# Altium footprint library PCB_GENERAL.PcbLib: 226 footprints (part 10 of 15)
Each footprint in its own frame and in the unit in brackets; x right, y up, seen from the top. Pads: shape width x height; smd on the part's side, far side on the other; paste and mask are expansions set on the pad; w line width, h text height; cw(c..) or ccw(c..) is an arc to the next point about the centre after c.
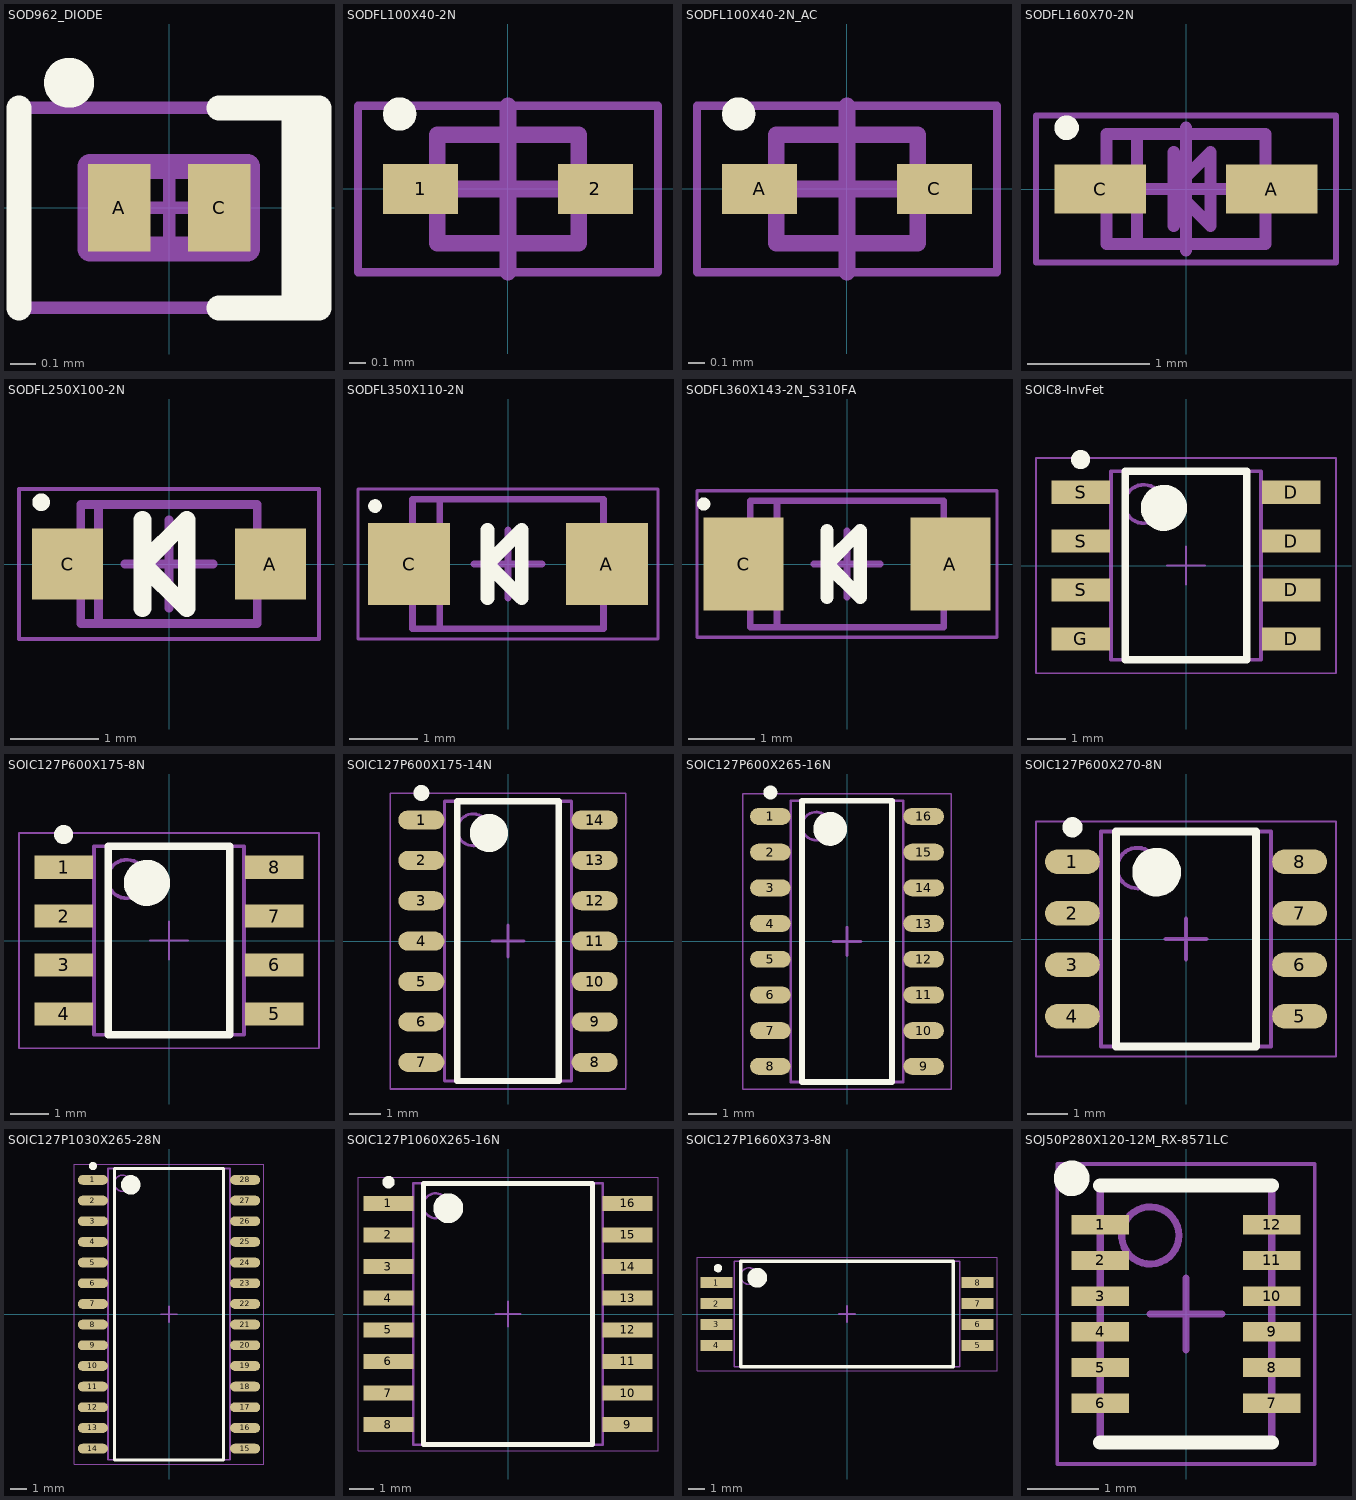
[diagram p9: the footprints below, top view; thin cyan lines are the x and y axes]

## SOD962_DIODE [mm] "DFN, 2-Leads, Body 0,30x0,60mm, Pitch 0,40mm, IPC Medium Density"
height 0.32
pads (2):
  rect 0.25x0.35 smd: A(-0.2,0) C(0.2,0)
Top Overlay:
  circle w0.1: c-0.4,0.5 r0.05
  lines w0.1: -0.6,-0.4 -0.6,0.4 ; 0.2,-0.4 0.6,-0.4 0.6,0.4 ; 0.2,0.4 0.6,0.4 ; 0.5,-0.4 0.5,0.4 0.6,0.4
Mechanical 13:
  lines w0.1: -0.1,-0.165 -0.065,-0.165 ; 0.175,-0.15 0.175,0.15 ; -0.315,-0.165 0.315,-0.165 0.315,0.165 -0.315,0.165 -0.315,-0.165
Mechanical 15:
  lines w0.05: -0.175,0 0.175,0 ; 0,-0.175 0,0.175 ; -0.6,-0.4 0.6,-0.4 0.6,0.4 -0.6,0.4 -0.6,-0.4
3D body: height 0.32, standoff 0, extent -0.315,-0.165 0.315,0.165

## SODFL100X40-2N [mm] "SODFL, 2-Leads, Body 0,60x1,00mm, IPC Medium Density"
height 0.4
pads (2):
  rect 0.45x0.3 smd: 1(-0.525,0) 2(0.525,0)
Top Overlay:
  circle w0.1: c-0.65,0.45 r0.05
Mechanical 11:
  text ".Designator" at -1.4,0.7 h1
Mechanical 13:
  lines w0.1: -0.425,-0.325 -0.425,0.325 0.425,0.325 0.425,-0.325 -0.425,-0.325
Mechanical 15:
  lines w0.05: -0.9,-0.5 -0.9,0.5 0.9,0.5 0.9,-0.5 -0.9,-0.5
  lines w0.1: -0.5,0 0.5,0 ; 0,-0.5 0,0.5
3D body: height 0.4, standoff 0, extent -0.425,-0.325 0.425,0.325

## SODFL100X40-2N_AC [mm] "SODFL, 2-Leads, Body 0,60x1,00mm, IPC Medium Density"
height 0.4
pads (2):
  rect 0.45x0.3 smd: A(-0.525,0) C(0.525,0)
Top Overlay:
  circle w0.1: c-0.65,0.45 r0.05
Mechanical 11:
  text ".Designator" at -1.4,0.7 h1
Mechanical 14:
  lines w0.1: -0.425,-0.325 0.425,-0.325 0.425,0.325 -0.425,0.325 -0.425,-0.325
Mechanical 15:
  lines w0.05: -0.9,-0.5 0.9,-0.5 0.9,0.5 -0.9,0.5 -0.9,-0.5
  lines w0.1: -0.5,0 0.5,0 ; 0,-0.5 0,0.5
3D body: height 0.4, standoff 0, extent -0.425,-0.325 0.425,0.325

## SODFL160X70-2N [mm] "SODFL, 2-Leads, Body 0,80x1,60mm, IPC Medium Density"
height 0.7
pads (2):
  rect 0.75x0.4 smd: A(0.7,0) C(-0.7,0)
Top Overlay:
  circle w0.1: c-0.975,0.5 r0.05
Mechanical 11:
  text ".Designator" at -0.4,-0.3 h1
Mechanical 14:
  lines w0.1: -0.4,-0.45 -0.4,0.45 ; -0.1,-0.3 -0.1,0.3 ; -0.65,-0.45 -0.65,0.45 0.65,0.45 0.65,-0.45 -0.65,-0.45 ; -0.1,0 0.2,0.3 0.2,-0.3 -0.1,0
Mechanical 15:
  lines w0.05: -1.225,-0.6 -1.225,0.6 1.225,0.6 1.225,-0.6 -1.225,-0.6
  lines w0.1: -0.5,0 0.5,0 ; 0,-0.5 0,0.5
3D body "SODFL160X70-2N.step": height 0.7, standoff 0, extent -0.8,-0.45 0.8,0.45

## SODFL250X100-2N [mm] "SODFL, 2-Leads, Body 1,25x2,50mm, IPC Medium Density"
height 1
pads (2):
  rect 0.8x0.8 smd: A(1.15,0) C(-1.15,0)
Top Overlay:
  circle w0.1: c-1.45,0.7 r0.05
  lines w0.2: -0.3,-0.5 -0.3,0.5 ; -0.3,0 0.2,-0.5 0.2,0.5 -0.3,0
Mechanical 11:
  text ".Designator" at -0.5,-0.2 h1
Mechanical 14:
  lines w0.1: -0.8,-0.675 -0.8,0.675 ; -0.3,-0.5 -0.3,0.5 ; -1,-0.675 -1,0.675 1,0.675 1,-0.675 -1,-0.675 ; -0.3,0 0.2,-0.5 0.2,0.5 -0.3,0
Mechanical 15:
  lines w0.05: -1.7,-0.85 -1.7,0.85 1.7,0.85 1.7,-0.85 -1.7,-0.85
  lines w0.1: -0.5,0 0.5,0 ; 0,-0.5 0,0.5
3D body "User Library-SOD323-1.STEP": height 1.1, standoff 0, extent -1.3,-0.675 1.3,0.675

## SODFL350X110-2N [mm] "SODFL, 2-Leads, Body 1,70x3,50mm, IPC Medium Density"
height 1.1
pads (2):
  rect 1.2x1.2 smd: A(1.45,0) C(-1.45,0)
Top Overlay:
  circle w0.1: c-1.95,0.85 r0.05
  lines w0.2: -0.3,-0.5 -0.3,0.5 ; -0.3,0 0.2,-0.5 0.2,0.5 -0.3,0
Mechanical 11:
  text ".Designator" at -0.75,-0.3 h1
Mechanical 14:
  lines w0.1: -1,-0.95 -1,0.95 ; -1.4,-0.95 -1.4,0.95 1.4,0.95 1.4,-0.95 -1.4,-0.95
Mechanical 15:
  lines w0.05: -2.2,-1.1 -2.2,1.1 2.2,1.1 2.2,-1.1 -2.2,-1.1
  lines w0.1: -0.5,0 0.5,0 ; 0,-0.5 0,0.5
3D body "SODFL350X110-2N.step": height 1.1, standoff 0, extent -1.75,-0.95 1.75,0.95

## SODFL360X143-2N_S310FA [mm] "SODFL, 2-Leads, Body 1,80x3,60mm, IPC Medium Density"
height 1.43
pads (2):
  rect 1.2x1.4 smd: A(1.55,0) C(-1.55,0)
Top Overlay:
  circle w0.1: c-2.15,0.9 r0.05
  lines w0.2: -0.3,-0.5 -0.3,0.5 ; -0.3,0 0.2,0.5 0.2,-0.5 -0.3,0
Mechanical 11:
  text ".Designator" at -0.6,-0.35 h1
Mechanical 14:
  lines w0.1: -1.05,-0.95 -1.05,0.95 ; -1.45,-0.95 1.45,-0.95 1.45,0.95 -1.45,0.95 -1.45,-0.95
Mechanical 15:
  lines w0.05: -2.25,-1.1 2.25,-1.1 2.25,1.1 -2.25,1.1 -2.25,-1.1
  lines w0.1: -0.5,0 0.5,0 ; 0,-0.5 0,0.5
3D body "SODFL360X143-2N_S310FA.step": height 1.43, standoff 0, extent -1.8,-0.95 1.8,0.95

## SOIC8-InvFet [mm] "SOIC, 8-Leads, Body 4.9x3.9mm, Pitch 1.27mm"
height 1.75
pads (8):
  rect 1.52x0.6 smd: D(2.74,-1.905) D(2.74,-0.635) D(2.74,0.635) D(2.74,1.905) G(-2.74,-1.905) S(-2.74,-0.635) S(-2.74,0.635) S(-2.74,1.905)
Top Overlay:
  circle w0.6: c-0.575,1.5 r0.3
  circle w0.25: c-2.74,2.755 r0.125
  lines w0.2: -1.58,-2.45 1.58,-2.45 1.58,2.45 -1.58,2.45 -1.58,-2.45
Mechanical 11:
  text ".Designator" at -4,0.5 h1
Mechanical 14:
  circle w0.1: c-1.1,1.6 r0.5
  lines w0.1: -1.95,-2.45 1.95,-2.45 1.95,2.45 -1.95,2.45 -1.95,-2.45
Mechanical 15:
  lines w0.05: -0.5,0 0.5,0 ; 0,-0.5 0,0.5 ; -3.9,-2.8 3.9,-2.8 3.9,2.8 -3.9,2.8 -3.9,-2.8
3D body: height 1.75, standoff 0.1, extent -1.95,-2.45 1.95,2.45

## SOIC127P600X175-8N [mm] "SOIC, 8-Leads, Body 4.9x3.9mm, Pitch 1.27mm"
height 1.75
pads (8):
  rect 1.52x0.6 smd: 1(-2.74,1.905) 2(-2.74,0.635) 3(-2.74,-0.635) 4(-2.74,-1.905) 5(2.74,-1.905) 6(2.74,-0.635) 7(2.74,0.635) 8(2.74,1.905)
Top Overlay:
  circle w0.25: c-2.74,2.755 r0.125
  circle w0.6: c-0.575,1.5 r0.3
  lines w0.2: -1.58,-2.45 -1.58,2.45 1.58,2.45 1.58,-2.45 -1.58,-2.45
Mechanical 11:
  text ".Designator" at -4,0.5 h1
Mechanical 14:
  circle w0.1: c-1.1,1.6 r0.5
  lines w0.1: -1.95,-2.45 -1.95,2.45 1.95,2.45 1.95,-2.45 -1.95,-2.45
Mechanical 15:
  lines w0.05: -0.5,0 0.5,0 ; 0,-0.5 0,0.5 ; -3.9,-2.8 -3.9,2.8 3.9,2.8 3.9,-2.8 -3.9,-2.8
3D body: height 1.75, standoff 0.1, extent -1.95,-2.45 1.95,2.45

## SOIC127P600X175-14N [mm] "SOIC, 14-Leads, Body 8,65x3,90mm, Pitch 1,27mm, IPC Medium Density"
height 1.75
pads (14):
  oval 1.45x0.6 smd: 1(-2.725,3.81) 2(-2.725,2.54) 3(-2.725,1.27) 4(-2.725,0) 5(-2.725,-1.27) 6(-2.725,-2.54) 7(-2.725,-3.81) 8(2.725,-3.81) 9(2.725,-2.54) 10(2.725,-1.27) 11(2.725,0) 12(2.725,1.27) 13(2.725,2.54) 14(2.725,3.81)
Top Overlay:
  circle w0.6: c-0.6,3.4 r0.3
  circle w0.25: c-2.725,4.66 r0.125
  lines w0.2: -1.6,-4.4 1.6,-4.4 1.6,4.4 -1.6,4.4 -1.6,-4.4
Mechanical 11:
  text ".Designator" at -1.35,-0.35 h1
Mechanical 14:
  circle w0.1: c-1.1,3.5 r0.5
  lines w0.1: -2,-4.4 2,-4.4 2,4.4 -2,4.4 -2,-4.4
Mechanical 15:
  lines w0.05: -3.7,-4.65 3.7,-4.65 3.7,4.65 -3.7,4.65 -3.7,-4.65
  lines w0.1: -0.5,0 0.5,0 ; 0,-0.5 0,0.5
3D body "SOIC-14.step": height 1.75, standoff 0, extent -3,-4.375 3,4.375

## SOIC127P600X265-16N [mm] "SOIC, 16-Leads, Body 9,90x3,90mm, Pitch 1,27mm, IPC Medium Density"
height 2.65
pads (16):
  oval 1.45x0.6 smd: 1(-2.725,4.445) 2(-2.725,3.175) 3(-2.725,1.905) 4(-2.725,0.635) 5(-2.725,-0.635) 6(-2.725,-1.905) 7(-2.725,-3.175) 8(-2.725,-4.445) 9(2.725,-4.445) 10(2.725,-3.175) 11(2.725,-1.905) 12(2.725,-0.635) 13(2.725,0.635) 14(2.725,1.905) 15(2.725,3.175) 16(2.725,4.445)
Top Overlay:
  circle w0.6: c-0.6,4 r0.3
  circle w0.25: c-2.725,5.295 r0.125
  lines w0.2: -1.6,-5 1.6,-5 1.6,5 -1.6,5 -1.6,-5
Mechanical 11:
  text ".Designator" at 0.2,0.525 h1
Mechanical 14:
  circle w0.1: c-1.1,4.1 r0.5
  lines w0.1: -2,-5 2,-5 2,5 -2,5 -2,-5
Mechanical 15:
  lines w0.05: -3.7,-5.25 3.7,-5.25 3.7,5.25 -3.7,5.25 -3.7,-5.25
  lines w0.1: -0.5,0 0.5,0 ; 0,-0.5 0,0.5
3D body: height 2.65, standoff 0.2, extent -2,-5 2,5

## SOIC127P600X270-8N [mm] "SOIC, 8-Leads, Body 5,10x3,95mm, Pitch 1,27mm, IPC Medium Density"
height 2.7
pads (8):
  oval 1.35x0.6 smd: 1(-2.8,1.905) 2(-2.8,0.635) 3(-2.8,-0.635) 4(-2.8,-1.905) 5(2.8,-1.905) 6(2.8,-0.635) 7(2.8,0.635) 8(2.8,1.905)
Top Overlay:
  circle w0.25: c-2.8,2.755 r0.125
  circle w0.6: c-0.725,1.65 r0.3
  lines w0.2: -1.725,-2.65 -1.725,2.65 1.725,2.65 1.725,-2.65 -1.725,-2.65
Mechanical 11:
  text ".Designator" at -1.3,-0.2 h1
Mechanical 14:
  circle w0.1: c-1.2,1.75 r0.5
  lines w0.1: -2.1,-2.65 -2.1,2.65 2.1,2.65 2.1,-2.65 -2.1,-2.65
Mechanical 15:
  lines w0.05: -3.7,-2.9 -3.7,2.9 3.7,2.9 3.7,-2.9 -3.7,-2.9
  lines w0.1: -0.5,0 0.5,0 ; 0,-0.5 0,0.5
3D body: height 2.7, standoff 0.2, extent -2.1,-2.65 2.1,2.65

## SOIC127P1030X265-28N [mm] "SOIC, 28-Leads, Body 17,90x7,50mm, Pitch 1,27mm, IPC Medium Density"
height 2.65
pads (28):
  oval 1.85x0.6 smd: 1(-4.675,8.255) 2(-4.675,6.985) 3(-4.675,5.715) 4(-4.675,4.445) 5(-4.675,3.175) 6(-4.675,1.905) 7(-4.675,0.635) 8(-4.675,-0.635) 9(-4.675,-1.905) 10(-4.675,-3.175) 11(-4.675,-4.445) 12(-4.675,-5.715) 13(-4.675,-6.985) 14(-4.675,-8.255) 15(4.675,-8.255) 16(4.675,-6.985) 17(4.675,-5.715) 18(4.675,-4.445) 19(4.675,-3.175) 20(4.675,-1.905) 21(4.675,-0.635) 22(4.675,0.635) 23(4.675,1.905) 24(4.675,3.175) 25(4.675,4.445) 26(4.675,5.715) 27(4.675,6.985) 28(4.675,8.255)
Top Overlay:
  circle w0.25: c-4.675,9.105 r0.125
  circle w0.6: c-2.35,7.95 r0.3
  lines w0.2: -3.35,-8.95 -3.35,8.95 3.35,8.95 3.35,-8.95 -3.35,-8.95
Mechanical 11:
  text ".Designator" at -5.7,9.6 h1
Mechanical 14:
  circle w0.1: c-2.85,8.05 r0.5
  lines w0.1: -3.75,-8.95 -3.75,8.95 3.75,8.95 3.75,-8.95 -3.75,-8.95
Mechanical 15:
  lines w0.05: -5.825,-9.2 -5.825,9.2 5.825,9.2 5.825,-9.2 -5.825,-9.2
  lines w0.1: -0.5,0 0.5,0 ; 0,-0.5 0,0.5
3D body: height 2.65, standoff 0.2, extent -3.75,-8.95 3.75,8.95

## SOIC127P1060X265-16N [mm] "SOIC, 16-Leads, Body 10,30x7,50mm, Pitch 1,27mm, IPC Medium Density"
height 2.65
pads (16):
  rect 2x0.6 smd: 1(-4.8,4.445) 2(-4.8,3.175) 3(-4.8,1.905) 4(-4.8,0.635) 5(-4.8,-0.635) 6(-4.8,-1.905) 7(-4.8,-3.175) 8(-4.8,-4.445) 9(4.8,-4.445) 10(4.8,-3.175) 11(4.8,-1.905) 12(4.8,-0.635) 13(4.8,0.635) 14(4.8,1.905) 15(4.8,3.175) 16(4.8,4.445)
Top Overlay:
  circle w0.6: c-2.4,4.25 r0.3
  circle w0.25: c-4.8,5.295 r0.125
  lines w0.2: -3.4,-5.25 3.4,-5.25 3.4,5.25 -3.4,5.25 -3.4,-5.25
Mechanical 11:
  text ".Designator" at -1.37,0.07 h1.52
Mechanical 14:
  circle w0.1: c-2.9,4.35 r0.5
  lines w0.1: -3.8,-5.25 3.8,-5.25 3.8,5.25 -3.8,5.25 -3.8,-5.25
Mechanical 15:
  lines w0.05: -6.025,-5.5 6.025,-5.5 6.025,5.5 -6.025,5.5 -6.025,-5.5
  lines w0.1: -0.5,0 0.5,0 ; 0,-0.5 0,0.5
3D body "SOIC127P1060X265-16N.step": height 2.65, standoff 0, extent -5.315,-5.25 5.315,5.25

## SOIC127P1660X373-8N [mm] "SOIC, 8-Leads, Body 6,25x13,60mm, Pitch 1,27mm, IPC Medium Density"
height 3.74
pads (8):
  rect 1.95x0.65 smd: 1(-7.925,1.905) 2(-7.925,0.635) 3(-7.925,-0.635) 4(-7.925,-1.905) 5(7.925,-1.905) 6(7.925,-0.635) 7(7.925,0.635) 8(7.925,1.905)
Top Overlay:
  circle w0.6: c-5.45,2.2 r0.3
  circle w0.25: c-7.825,2.78 r0.125
  lines w0.2: -6.45,-3.2 6.45,-3.2 6.45,3.2 -6.45,3.2 -6.45,-3.2
Mechanical 11:
  text ".Designator" at -3.7,-0.2 h1
Mechanical 14:
  circle w0.1: c-5.95,2.3 r0.5
  lines w0.1: -6.85,-3.2 6.85,-3.2 6.85,3.2 -6.85,3.2 -6.85,-3.2
Mechanical 15:
  lines w0.05: -9.1,-3.45 9.1,-3.45 9.1,3.45 -9.1,3.45 -9.1,-3.45
  lines w0.1: -0.5,0 0.5,0 ; 0,-0.5 0,0.5
3D body "SOIC127P1660X373-8N.step": height 3.73, standoff 0, extent -8.305,-3.2 8.305,3.2

## SOJ50P280X120-12M_RX-8571LC [mm] "SOJ, 12-Leads, Body 3,60x2,80mm, Pitch 0,50mm, IPC Low Density"
height 1.2
pads (12):
  rect 0.8x0.27 smd: 1(-1.2,1.25) 2(-1.2,0.75) 3(-1.2,0.25) 4(-1.2,-0.25) 5(-1.2,-0.75) 6(-1.2,-1.25) 7(1.2,-1.25) 8(1.2,-0.75) 9(1.2,-0.25) 10(1.2,0.25) 11(1.2,0.75) 12(1.2,1.25)
Top Overlay:
  circle w0.25: c-1.6,1.9 r0.125
  lines w0.2: -1.2,-1.8 1.2,-1.8 ; -1.2,1.8 1.2,1.8
Mechanical 11:
  text ".Designator" at -1.172,-0.122 h1
Mechanical 14:
  circle w0.1: c-0.5,1.1 r0.4
  lines w0.1: -1.2,-1.8 -1.2,1.8 1.2,1.8 1.2,-1.8 -1.2,-1.8
Mechanical 15:
  lines w0.05: -1.8,-2.1 -1.8,2.1 1.8,2.1 1.8,-2.1 -1.8,-2.1
  lines w0.1: -0.5,0 0.5,0 ; 0,-0.5 0,0.5
3D body: height 1.2, standoff 0, extent -1.2,-1.8 1.2,1.8